# Altium footprint library KwantLib.PcbLib: 249 footprints (part 13 of 16)
Each footprint in its own frame and in the unit in brackets; x right, y up, seen from the top. Pads: shape width x height; smd on the part's side, far side on the other; paste and mask are expansions set on the pad; w line width, h text height; cw(c..) or ccw(c..) is an arc to the next point about the centre after c.
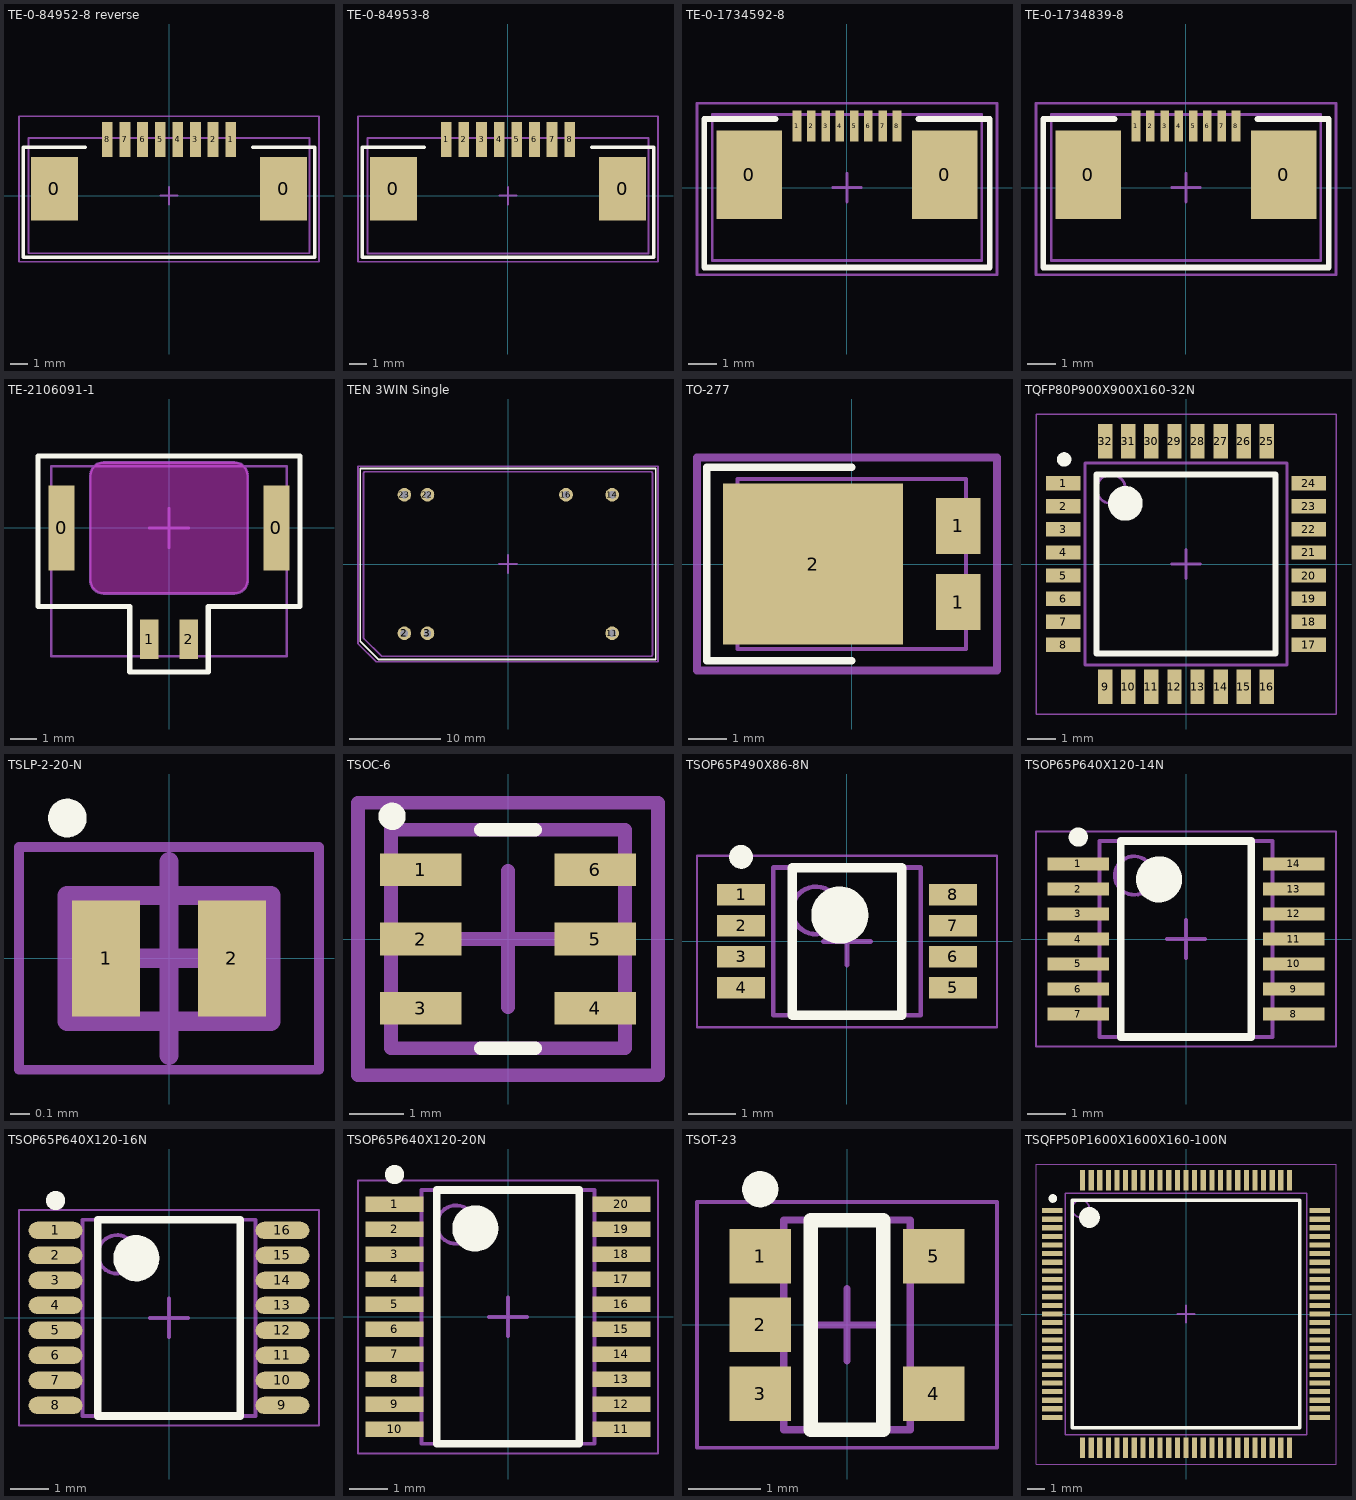
[diagram p12: the footprints below, top view; thin cyan lines are the x and y axes]

## TE-0-84952-8 reverse [mm] "FPC Connector, 1.0mm pitch, Bottom contact, 8 pins"
height 2.56
pads (10):
  rect 2.68x3.6 smd paste-0.07 mask+0.07: 0(-6.49,0.38) 0(6.49,0.38)
  rect 0.61x2 smd paste-0.05 mask+0.07: 1(3.5,3.18) 2(2.5,3.18) 3(1.5,3.18) 4(0.5,3.18) 5(-0.5,3.18) 6(-1.5,3.18) 7(-2.5,3.18) 8(-3.5,3.18)
Top Overlay:
  lines w0.2: -4.75,2.75 -8.25,2.75 -8.25,-3.5 8.25,-3.5 8.25,2.75 4.75,2.75
Mechanical 13:
  lines w0.1: -7.965,-3.27 -7.965,3.27 7.965,3.27 7.965,-3.27 -7.965,-3.27
Mechanical 15:
  lines w0.1: -0.5,0 0.5,0 ; 0,-0.5 0,0.5 ; -8.5,-3.75 -8.5,4.5 8.5,4.5 8.5,-3.75 -8.5,-3.75
3D body "84952-8-norm.stp": height 2.56, standoff 0, extent -7.965,-3.27 7.965,3.27

## TE-0-84953-8 [mm] "FPC Connector, 1.0mm pitch, Top contact, 8 pins"
height 2.56
pads (10):
  rect 2.68x3.6 smd mask+0.07: 0(-6.49,0.38) 0(6.49,0.38)
  rect 0.61x2 smd mask+0.07: 1(-3.5,3.18) 2(-2.5,3.18) 3(-1.5,3.18) 4(-0.5,3.18) 5(0.5,3.18) 6(1.5,3.18) 7(2.5,3.18) 8(3.5,3.18)
Top Overlay:
  lines w0.2: -4.749,2.75 -8.249,2.75 -8.249,-3.5 8.251,-3.5 8.251,2.75 4.751,2.75
Mechanical 13:
  lines w0.1: -7.965,-3.28 7.965,-3.28 7.965,3.27 -7.965,3.27 -7.965,-3.28
Mechanical 15:
  lines w0.1: -0.499,0 0.501,0 ; 0.001,-0.5 0.001,0.5 ; -8.499,-3.75 8.501,-3.75 8.501,4.5 -8.499,4.5 -8.499,-3.75
3D body "84953-8-norm.stp": height 2.58, standoff 0, extent -7.965,-3.28 7.965,3.27

## TE-0-1734592-8 [mm] "FPC Connector, 0.5mm pitch, Bottom contact, 8 pins"
height 2
pads (10):
  rect 2.3x3.1 smd mask+0.07: 0(-3.42,0.455) 0(3.42,0.455)
  rect 0.3x1.1 smd mask+0.07: 1(-1.75,2.155) 2(-1.25,2.155) 3(-0.75,2.155) 4(-0.25,2.155) 5(0.25,2.155) 6(0.75,2.155) 7(1.25,2.155) 8(1.75,2.155)
Top Overlay:
  lines w0.2: -2.5,2.4 -5,2.4 -5,-1.55 -5,-2.8 5,-2.8 5,-1.55 5,2.4 2.5,2.4
Mechanical 13:
  lines w0.1: -4.715,-2.555 4.715,-2.555 4.715,2.555 -4.715,2.555 -4.715,-2.555
Mechanical 15:
  lines w0.1: -0.5,0 0.5,0 ; 0,-0.5 0,0.5 ; -5.25,-3.05 -5.25,2.95 5.25,2.95 5.25,-3.05 -5.25,-3.05
3D body "C-1734592-8_norm.stp": height 2.05, standoff 0, extent -4.715,-2.555 4.715,2.555

## TE-0-1734839-8 [mm] "FPC Connector, 0.5mm pitch, Top contact, 8 pins"
height 2
pads (10):
  rect 2.3x3.1 smd mask+0.07: 0(-3.42,0.455) 0(3.42,0.455)
  rect 0.3x1.1 smd mask+0.07: 1(-1.75,2.155) 2(-1.25,2.155) 3(-0.75,2.155) 4(-0.25,2.155) 5(0.25,2.155) 6(0.75,2.155) 7(1.25,2.155) 8(1.75,2.155)
Top Overlay:
  lines w0.2: -2.5,2.4 -5,2.4 -5,-1.55 -5,-2.8 5,-2.8 5,-1.55 5,2.4 2.5,2.4
Mechanical 13:
  lines w0.1: -4.715,-2.555 -4.715,2.555 4.715,2.555 4.715,-2.555 -4.715,-2.555
Mechanical 15:
  lines w0.1: -0.5,0 0.5,0 ; 0,-0.5 0,0.5 ; -5.25,-3.05 5.25,-3.05 5.25,2.95 -5.25,2.95 -5.25,-3.05
3D body "C-1734839-8_norm.stp": height 2.03, standoff -0.02, extent -4.715,-2.555 4.715,2.555

## TE-2106091-1 [mm] "2-pin thru board inverted SMT Connector"
pads (4):
  rect 1x3.25 smd mask+0.07: 0(-4.1,0) 0(4.1,0)
  rect 0.7x1.5 smd mask+0.07: 1(-0.75,-4.25) 2(0.75,-4.25)
Top Overlay:
  lines w0.2: -5,-3 -5,-2 -5,2.75 5,2.75 5,-2 5,-3 1.5,-3 1.5,-5.5 -1.5,-5.5 -1.5,-3 -5,-3
Keep-Out Layer:
  board cut-out: -2.5,-2.5 -2.599,-2.5 -2.783,-2.424 -2.924,-2.283 -3,-2.099 -3,-2 -3,2 -3,2.099 -2.924,2.283 -2.783,2.424 -2.599,2.5 -2.5,2.5 2.5,2.5 2.599,2.5 2.783,2.424 2.924,2.283 3,2.099 3,2 3,-2 3,-2.099 2.924,-2.283 2.783,-2.424 2.599,-2.5 2.5,-2.5
Mechanical 13:
  lines w0.1: -4.5,-4.9 -4.5,2.35 4.5,2.35 4.5,-4.9 -4.5,-4.9 ; -3,-2 ccw(c-2.5,-2) -2.5,-2.5 2.5,-2.5 ccw(c2.5,-2) 3,-2 3,2 ccw(c2.5,2) 2.5,2.5 -2.5,2.5 ccw(c-2.5,2) -3,2 -3,-2
  text "1 - black / 2 - red" at 1.5,-4.2 h1
Mechanical 15:
  lines w0.1: -0.75,0 0.75,0 ; 0,-0.75 0,0.75
3D body "c-2106091-1-a-3d-full-norm.stp": height 3.35, standoff -7.05, extent -4.5,-4.9 4.5,2.35

## TEN 3WIN Single [mm] "Traco Power TEN 3WIN Module, Single output"
height 10.2
pads (7):
  round 1.5 hole 0.8 mask+0.07: 2(-11.4,-7.62) 3(-8.86,-7.62) 11(11.46,-7.62) 14(11.46,7.62) 16(6.38,7.62) 22(-8.86,7.62) 23(-11.4,7.62)
Top Overlay:
  lines w0.2: -16.25,-8.5 -16.25,10.5 16.25,10.5 16.25,-10.5 -14.25,-10.5 -16.25,-8.5
Mechanical 13:
  lines w0.2: -15.9,-8.067 ccw(c-15.7,-8.067) -15.841,-8.209 -13.959,-10.091 ccw(c-13.817,-9.95) -13.817,-10.15 -11.9,-10.15 11.9,-10.15 15.7,-10.15 ccw(c15.7,-9.95) 15.9,-9.95 15.9,-6.15 15.9,6.15 15.9,9.95 ccw(c15.7,9.95) 15.7,10.15 11.9,10.15 -11.9,10.15 -15.7,10.15 ccw(c-15.7,9.95) -15.9,9.95 -15.9,6.15 -15.9,-6.15 -15.9,-8.067
Mechanical 15:
  lines w0.2: -1,0 1,0 ; 0,-1 0,1 ; -16.5,-8.75 -16.5,10.75 16.5,10.75 16.5,-10.75 -14.5,-10.75 -16.5,-8.75
3D body "TEN 3WIN Single.stp": height 10.2, standoff -2.7, extent -15.9,-10.15 15.9,10.15

## TO-277 [mm]
height 1.2
pads (3):
  rect 1.15x1.45 smd: 1(2.75,-0.985) 1(2.75,0.985)
  rect 4.65x4.15 smd: 2(-1,0)
Top Overlay:
  lines w0.2: 0,-2.5 -3.75,-2.5 -3.75,2.5 0,2.5
Mechanical 13:
  lines w0.1: -2.95,-2.2 2.95,-2.2 2.95,2.2 -2.95,2.2 -2.95,-2.2
Mechanical 15:
  lines w0.2: -1,0 1,0 ; 0,-1 0,1 ; -4,-2.75 -4,2.75 3.75,2.75 3.75,-2.75 -4,-2.75
3D body: height 1.2, standoff 0.1, extent -2.95,-2.2 2.95,2.2

## TQFP80P900X900X160-32N [mm] "TQFP, 32-Leads, Body 7.00x7.00mm, Pitch 0.80mm, IPC Medium Density"
height 1.6
pads (32):
  rect 1.2x0.5 smd paste-0.05 mask+0.07: 1(-4.25,2.8) 2(-4.25,2) 3(-4.25,1.2) 4(-4.25,0.4) 5(-4.25,-0.4) 6(-4.25,-1.2) 7(-4.25,-2) 8(-4.25,-2.8) 17(4.25,-2.8) 18(4.25,-2) 19(4.25,-1.2) 20(4.25,-0.4) 21(4.25,0.4) 22(4.25,1.2) 23(4.25,2) 24(4.25,2.8)
  rect 0.5x1.2 smd paste-0.05 mask+0.07: 9(-2.8,-4.25) 10(-2,-4.25) 11(-1.2,-4.25) 12(-0.4,-4.25) 13(0.4,-4.25) 14(1.2,-4.25) 15(2,-4.25) 16(2.8,-4.25) 25(2.8,4.25) 26(2,4.25) 27(1.2,4.25) 28(0.4,4.25) 29(-0.4,4.25) 30(-1.2,4.25) 31(-2,4.25) 32(-2.8,4.25)
Top Overlay:
  circle w0.6: c-2.1,2.1 r0.3
  circle w0.25: c-4.225,3.625 r0.125
  lines w0.2: -3.1,-3.1 3.1,-3.1 3.1,3.1 -3.1,3.1 -3.1,-3.1
Mechanical 13:
  circle w0.1: c-2.6,2.6 r0.5
  lines w0.1: -3.5,-3.5 3.5,-3.5 3.5,3.5 -3.5,3.5 -3.5,-3.5
Mechanical 15:
  lines w0.05: -5.2,-5.2 5.2,-5.2 5.2,5.2 -5.2,5.2 -5.2,-5.2
  lines w0.1: -0.5,0 0.5,0 ; 0,-0.5 0,0.5
3D body "TQFP80P900X900X160-32N.step": height 1.6, standoff 0, extent -4.5,-4.5 4.5,4.5

## TSLP-2-20-N [mm] "DFN, 2-Leads, Body 0,60x1,00mm, Pitch 0,65mm, IPC Medium Density"
height 0.31
pads (2):
  rect 0.35x0.6 smd paste-0.04 mask+0.07: 1(-0.325,0) 2(0.325,0)
Top Overlay:
  circle w0.1: c-0.525,0.725 r0.05
Mechanical 13:
  lines w0.1: -0.525,-0.325 0.525,-0.325 0.525,0.325 -0.525,0.325 -0.525,-0.325
Mechanical 15:
  lines w0.05: -0.775,-0.575 0.775,-0.575 0.775,0.575 -0.775,0.575 -0.775,-0.575
  lines w0.1: -0.5,0 0.5,0 ; 0,-0.5 0,0.5
3D body "DFN65P100X31-2N.step": height 0.31, standoff 0, extent -0.525,-0.325 0.525,0.325

## TSOC-6 [mm] "Maxim Intergrated"
height 1.5
pads (6):
  rect 1.5x0.6 smd paste-0.05 mask+0.07: 1(-1.6,1.27) 2(-1.6,0) 3(-1.6,-1.27) 4(1.6,-1.27) 5(1.6,0) 6(1.6,1.27)
Top Overlay:
  circle w0.25: c-2.125,2.25 r0.125
  lines w0.25: -0.5,-2 0.5,-2 ; -0.5,2 0.5,2
Mechanical 13:
  lines w0.25: -2.145,-2 2.145,-2 2.145,2 -2.145,2 -2.145,-2
Mechanical 15:
  lines w0.25: -1.25,0 1.25,0 ; 0,-1.25 0,1.25 ; -2.75,-2.5 -2.75,2.5 2.75,2.5 2.75,-2.5 -2.75,-2.5
3D body: height 1.4, standoff 0.01, extent -2.145,-2 2.145,2

## TSOP65P490X86-8N [mm] "TSOP, 8-Leads, Body 3.00x3.00mm, Pitch 0.65mm, IPC Medium Density"
height 0.86
pads (8):
  rect 1x0.45 smd paste-0.05 mask+0.07: 1(-2.225,0.975) 2(-2.225,0.325) 3(-2.225,-0.325) 4(-2.225,-0.975) 5(2.225,-0.975) 6(2.225,-0.325) 7(2.225,0.325) 8(2.225,0.975)
Top Overlay:
  circle w0.6: c-0.15,0.55 r0.3
  circle w0.25: c-2.225,1.775 r0.125
  lines w0.2: -1.15,-1.55 1.15,-1.55 1.15,1.55 -1.15,1.55 -1.15,-1.55
Mechanical 13:
  circle w0.1: c-0.65,0.65 r0.5
  lines w0.1: -1.55,-1.55 1.55,-1.55 1.55,1.55 -1.55,1.55 -1.55,-1.55
Mechanical 15:
  lines w0.05: -3.15,-1.8 3.15,-1.8 3.15,1.8 -3.15,1.8 -3.15,-1.8
  lines w0.1: -0.5,0 0.5,0 ; 0,-0.5 0,0.5
3D body "TSOP65P490X86-8N.step": height 0.86, standoff 0, extent -2.45,-1.55 2.45,1.55

## TSOP65P640X120-14N [mm] "TSOP, 14-Leads, Body 5.00x4.40mm, Pitch 0.65mm, IPC Medium Density"
height 1.2
pads (14):
  rect 1.6x0.35 smd mask+0.07: 1(-2.8,1.95) 2(-2.8,1.3) 3(-2.8,0.65) 4(-2.8,0) 5(-2.8,-0.65) 6(-2.8,-1.3) 7(-2.8,-1.95) 8(2.8,-1.95) 9(2.8,-1.3) 10(2.8,-0.65) 11(2.8,0) 12(2.8,0.65) 13(2.8,1.3) 14(2.8,1.95)
Top Overlay:
  circle w0.6: c-0.7,1.55 r0.3
  circle w0.25: c-2.8,2.65 r0.125
  lines w0.2: -1.7,-2.55 1.7,-2.55 1.7,2.55 -1.7,2.55 -1.7,-2.55
Mechanical 13:
  circle w0.1: c-1.35,1.65 r0.5
  lines w0.1: -2.25,-2.55 2.25,-2.55 2.25,2.55 -2.25,2.55 -2.25,-2.55
Mechanical 15:
  lines w0.05: -3.9,-2.8 3.9,-2.8 3.9,2.8 -3.9,2.8 -3.9,-2.8
  lines w0.1: -0.5,0 0.5,0 ; 0,-0.5 0,0.5
3D body "TSOP65P640X120-14N.step": height 1.2, standoff 0, extent -3.2,-2.55 3.2,2.55

## TSOP65P640X120-16N [mm] "TSOP, 16-Leads, Body 5,00x4,40mm, Pitch 0,65mm, IPC Medium Density"
height 1.2
pads (16):
  oval 1.4x0.45 smd paste-0.03 mask+0.07: 1(-2.95,2.275) 2(-2.95,1.625) 3(-2.95,0.975) 4(-2.95,0.325) 5(-2.95,-0.325) 6(-2.95,-0.975) 7(-2.95,-1.625) 8(-2.95,-2.275) 9(2.95,-2.275) 10(2.95,-1.625) 11(2.95,-0.975) 12(2.95,-0.325) 13(2.95,0.325) 14(2.95,0.975) 15(2.95,1.625) 16(2.95,2.275)
Top Overlay:
  circle w0.25: c-2.95,3.05 r0.125
  circle w0.6: c-0.85,1.55 r0.3
  lines w0.2: -1.85,-2.55 -1.85,2.55 1.85,2.55 1.85,-2.55 -1.85,-2.55
Mechanical 13:
  circle w0.1: c-1.35,1.65 r0.5
  lines w0.1: -2.25,-2.55 -2.25,2.55 2.25,2.55 2.25,-2.55 -2.25,-2.55
Mechanical 15:
  lines w0.05: -3.9,-2.8 -3.9,2.8 3.9,2.8 3.9,-2.8 -3.9,-2.8
  lines w0.1: -0.5,0 0.5,0 ; 0,-0.5 0,0.5
3D body "TSOP65P640X120-16N.step": height 1.2, standoff 0, extent -3.2,-2.55 3.2,2.55

## TSOP65P640X120-20N [mm] "TSOP, 20-Leads, Body 6.50x4.40mm, Pitch 0.65mm, IPC Medium Density"
height 1.2
pads (20):
  rect 1.5x0.4 smd paste-0.05 mask+0.07: 1(-2.95,2.925) 2(-2.95,2.275) 3(-2.95,1.625) 4(-2.95,0.975) 5(-2.95,0.325) 6(-2.95,-0.325) 7(-2.95,-0.975) 8(-2.95,-1.625) 9(-2.95,-2.275) 10(-2.95,-2.925) 11(2.95,-2.925) 12(2.95,-2.275) 13(2.95,-1.625) 14(2.95,-0.975) 15(2.95,-0.325) 16(2.95,0.325) 17(2.95,0.975) 18(2.95,1.625) 19(2.95,2.275) 20(2.95,2.925)
Top Overlay:
  circle w0.25: c-2.95,3.7 r0.125
  circle w0.6: c-0.85,2.3 r0.3
  lines w0.2: -1.85,-3.3 -1.85,3.3 1.85,3.3 1.85,-3.3 -1.85,-3.3
Mechanical 13:
  circle w0.1: c-1.35,2.4 r0.5
  lines w0.1: -2.25,-3.3 -2.25,3.3 2.25,3.3 2.25,-3.3 -2.25,-3.3
Mechanical 15:
  lines w0.05: -3.9,-3.55 -3.9,3.55 3.9,3.55 3.9,-3.55 -3.9,-3.55
  lines w0.1: -0.5,0 0.5,0 ; 0,-0.5 0,0.5
3D body "TSOP65P640X120-20N.step": height 1.2, standoff 0, extent -3.2,-3.3 3.2,3.3

## TSOT-23 [mm] "SOT23, 5-Leads, Body 2.90x2.80mm, Pitch 0.95mm, IPC Medium Density"
height 1
pads (5):
  rect 0.854x0.754 smd: 1(-1.2,0.95) 2(-1.2,0) 3(-1.2,-0.95) 4(1.2,-0.95) 5(1.2,0.95)
Top Overlay:
  circle w0.25: c-1.2,1.877 r0.125
  lines w0.2: -0.5,-1.45 -0.5,1.45 0.5,1.45 0.5,-1.45 -0.5,-1.45
Mechanical 13:
  lines w0.1: -0.875,-1.45 0.875,-1.45 0.875,1.45 -0.875,1.45 -0.875,-1.45
Mechanical 15:
  lines w0.05: -2.075,-1.7 2.075,-1.7 2.075,1.7 -2.075,1.7 -2.075,-1.7
  lines w0.1: -0.5,0 0.5,0 ; 0,-0.5 0,0.5
3D body "TSOT-23.step": height 1, standoff 0, extent -1.4,-1.45 1.4,1.45

## TSQFP50P1600X1600X160-100N [mm] "TSQFP, 100-Leads, Body 14.00x14.00mm, Pitch 0.50mm, IPC Medium Density"
height 1.6
pads (100):
  rect 1.2x0.3 smd paste-0.03 mask+0.07: 1(-7.75,6) 2(-7.75,5.5) 3(-7.75,5) 4(-7.75,4.5) 5(-7.75,4) 6(-7.75,3.5) 7(-7.75,3) 8(-7.75,2.5) 9(-7.75,2) 10(-7.75,1.5) 11(-7.75,1) 12(-7.75,0.5) 13(-7.75,0) 14(-7.75,-0.5) 15(-7.75,-1) 16(-7.75,-1.5) 17(-7.75,-2) 18(-7.75,-2.5) 19(-7.75,-3) 20(-7.75,-3.5) 21(-7.75,-4) 22(-7.75,-4.5) 23(-7.75,-5) 24(-7.75,-5.5) 25(-7.75,-6) 51(7.75,-6) 52(7.75,-5.5) 53(7.75,-5) 54(7.75,-4.5) 55(7.75,-4) 56(7.75,-3.5) 57(7.75,-3) 58(7.75,-2.5) 59(7.75,-2) 60(7.75,-1.5) 61(7.75,-1) 62(7.75,-0.5) 63(7.75,0) 64(7.75,0.5) 65(7.75,1) 66(7.75,1.5) 67(7.75,2) 68(7.75,2.5) 69(7.75,3) 70(7.75,3.5) 71(7.75,4) 72(7.75,4.5) 73(7.75,5) 74(7.75,5.5) 75(7.75,6)
  rect 0.3x1.2 smd paste-0.03 mask+0.07: 26(-6,-7.75) 27(-5.5,-7.75) 28(-5,-7.75) 29(-4.5,-7.75) 30(-4,-7.75) 31(-3.5,-7.75) 32(-3,-7.75) 33(-2.5,-7.75) 34(-2,-7.75) 35(-1.5,-7.75) 36(-1,-7.75) 37(-0.5,-7.75) 38(0,-7.75) 39(0.5,-7.75) 40(1,-7.75) 41(1.5,-7.75) 42(2,-7.75) 43(2.5,-7.75) 44(3,-7.75) 45(3.5,-7.75) 46(4,-7.75) 47(4.5,-7.75) 48(5,-7.75) 49(5.5,-7.75) 50(6,-7.75) 76(6,7.75) 77(5.5,7.75) 78(5,7.75) 79(4.5,7.75) 80(4,7.75) 81(3.5,7.75) 82(3,7.75) 83(2.5,7.75) 84(2,7.75) 85(1.5,7.75) 86(1,7.75) 87(0.5,7.75) 88(0,7.75) 89(-0.5,7.75) 90(-1,7.75) 91(-1.5,7.75) 92(-2,7.75) 93(-2.5,7.75) 94(-3,7.75) 95(-3.5,7.75) 96(-4,7.75) 97(-4.5,7.75) 98(-5,7.75) 99(-5.5,7.75) 100(-6,7.75)
Top Overlay:
  circle w0.6: c-5.6,5.6 r0.3
  circle w0.25: c-7.725,6.7 r0.125
  lines w0.2: -6.6,-6.6 6.6,-6.6 6.6,6.6 -6.6,6.6 -6.6,-6.6
Mechanical 13:
  circle w0.1: c-6.1,6.1 r0.5
  lines w0.1: -7,-7 7,-7 7,7 -7,7 -7,-7
Mechanical 15:
  lines w0.05: -8.7,-8.7 8.7,-8.7 8.7,8.7 -8.7,8.7 -8.7,-8.7
  lines w0.1: -0.5,0 0.5,0 ; 0,-0.5 0,0.5
3D body "TSQFP50P1600X1600X160-100N.step": height 1.6, standoff 0, extent -8,-8 8,8